# Altium integrated library Mastermind Devices.IntLib: 910 symbols (part 4 of 6) (continued)
## RK3566 (continued)
part D pins: 1A20 SDMMC1_D3/UART7_TX_M0/GPIO2_A6_U (io), 1C19 SDMMC1_D0/UART6_RX_M0/GPIO2_A3_U (io), 1C20 UART1_RX_M0/GPIO2_B3_U (io), 1D18 SDMMC1_D2/UART7_RX_M0/GPIO2_A5_U (io), 1D20 SDMMC0_D2/ARM_JTAG_TCK/UART5_~{CTS}_M0/GPIO1_D7_U (io), 1E18 SDMMC1_D1/UART6_TX_M0/GPIO2_A4_U (io), 1E19 SDMMC0_CMD/PWM10_M1/UART5_RX_M0/GPIO2_A1_U (io), 1E20 SDMMC0_D0/UART2_TX_M1/UART6_TX_M1/PWM8_M1/GPIO1_D5_U (io), 1F18 SDMMC0_D3/ARM_JTAG_TMS/UART5_~{RTS}_M0/GPIO2_A0_U (io), 1F19 SDMMC0_D1/UART2_RX_M1/UART6_RX_M1/PWM9_M1/GPIO1_D6_U (io), 1T4 VOP_BT1120_D11/GMAC1_TXD0_M0/I2C3_SCL_M1/PWM10_M0/GPIO3_B5_D (io), 1U3 VOP_BT1120_D10/GMAC1_RXER_M0/I2C5_SDA_M0/PDM_SDI1_M2/GPIO3_B4_D (io), 1U4 VOP_BT1120_CLK/GMAC1_TXCLK_M0/I2S3_SDI_M0/SDMMC2_CLK_M1/GPIO3_A6_D (io), 1U5 VOP_BT1120_D0/SPI1_CS0_M1/SDMMC2_D0_M1/GPIO3_A1_D (io), 1U18 UART2_TX_M0/GPIO0_D1_U (io), 1V2 VOP_BT1120_D12/GMAC1_TXD1_M0/I2C3_SDA_M1/PWM11_IR_M0/GPIO3_B6_D (io), 1V3 VOP_BT1120_D5/GMAC1_RXCLK_M0/SDMMC2_DET_M1/GPIO3_A7_D (io), 1V19 UART2_RX_M0/GPIO0_D0_U (io), A35 SDMMC1_PWREN/I2C4_SDA_M1/UART8_~{RTS}_M0/GPIO2_B1_D (io), AF37 SDMMC0_DET/SATA_CP_DET/GPIO0_A4_U (io), AG37 SDMMC0_PWREN/SATA_MP_SWITCH/PCIE20_~{CLKREQ}_M0/GPIO0_A5_D (io), AP3 VOP_BT1120_D14/SPI1_MISO_M1/UART5_TX_M1/I2S1_SDO3_M2/GPIO3_C2_D (io), AP4 VOP_BT1120_D13/SPI1_MOSI_M1/PCIE20_~{PERST}_M1/I2S1_SDO2_M2/GPIO3_C1_D (io), AP6 VOP_BT1120_D9/GMAC1_RXDV_CRS_M0/I2C5_SCL_M0/PDM_SDI0_M2/GPIO3_B3_D (io), AP7 VOP_BT1120_D7/GMAC1_RXD0_M0/UART4_RX_M1/PWM8_M0/GPIO3_B1_D (io), AP9 VOP_BT1120_D4/GMAC1_RXD3_M0/I2S3_SDO_M0/SDMMC2_CMD_M1/GPIO3_A5_D (io), AP10 VOP_BT1120_D2/GMAC1_TXD3_M0/I2S3_SCLK_M0/SDMMC2_D2_M1/GPIO3_A3_D (io), AR2 VOP_BT1120_D15/SPI1_CLK_M1/UART5_RX_M1/I2S1_SCLK_RX_M2/GPIO3_C3_D (io), AR6 VOP_BT1120_D8/GMAC1_RXD1_M0/UART4_TX_M1/PWM9_M0/GPIO3_B2_D (io), AR7 VOP_BT1120_D6/ETH1_REFCLKO_25M_M0/SDMMC2_PWREN_M1/GPIO3_B0_D (io), AR9 VOP_BT1120_D3/GMAC1_RXD2_M0/I2S3_LRCK_M0/SDMMC2_D3_M1/GPIO3_A4_D (io), AR10 VOP_BT1120_D1/GMAC1_TXD2_M0/I2S3_MCLK_M0/SDMMC2_D1_M1/GPIO3_A2_D (io), B34 SDMMC1_DET/I2C4_SCL_M1/UART8_~{CTS}_M0/GPIO2_B2_U (io), B35 SDMMC1_CMD/UART9_RX_M0/GPIO2_A7_U (io), B37 SDMMC1_CLK/UART9_TX_M0/GPIO2_B0_D (io), F37 UART1_~{RTS}_M0/SPI1_CLK_M0/GPIO2_B5_U (io), F38 UART1_TX_M0/GPIO2_B4_U (io), G37 UART1_~{CTS}_M0/SPI1_MISO_M0/GPIO2_B6_U (io), G38 SDMMC0_CLK/TEST_CLKOUT/UART5_TX_M0/GPIO2_A2_D (io)
part E pins: 1A1 ~{RAS} (io), 1A2 ~{ACT}/~{LPDDR}4_~{CKE}1_~{B}/~{DDR}3_~{CAS}/-/~{AC}1~{7} (io), 1A3 DDR4_A10/LPDDR4_CKE0_B/DDR3_A10/-/AC10 (io), 1A4 DDR4_BG0/LPDDR4_ODT1_CA_B/DDR3_~{WE}/-/AC20 (io), 1A5 ~{CS1} (io), 1A6 DDR4_BA1/LPDDR4_A4_B/DDR3_A12/LPDDR3_A4/AC19 (io), 1A7 DDR_DQ3_B/DDR4_DQU1_B/LPDDR4_DQ3_B/DDR3_DQ19/LPDDR3_DQ4 (io), 1A8 DDR_DQ2_B/DDR4_DQU3_B/LPDDR4_DQ2_B/DDR3_DQ18/LPDDR3_DQ6 (io), 1A9 DDR_DQ7_B/DDR4_DQU2_B/LPDDR4_DQ7_B/DDR3_DQ23/LPDDR3_DQ0 (io), 1A10 DDR_DQ5_B/DDR4_DQU6_B/LPDDR4_DQ5_B/DDR3_DQ21/LPDDR3_DQ3 (io), 1A11 DDR_DM1_B/DDR4_DML_B/LPDDR4_DM1_B/DDR3_DM3/LPDDR3_DM2 (io), 1B1 DDR4_A14_~{WE}/LPDDR4_A4_A/DDR3_A15/LPDDR3_A5/AC14 (io), 1B3 DDR4_A12/LPDDR4_A3_A/DDR3_BA2/-/AC12 (io), 1B5 ~{CS0} (io), 1B6 DDR4_A4/LPDDR4_A3_B/DDR3_BA1/LPDDR3_A3/AC4 (io), 1B7 DDR4_BA0/LPDDR4_A2_B/DDR3_A1/-/AC18 (io), 1B8 DDR_DM0_B/DDR4_DMU_B/LPDDR4_DM0_B/DDR3_DM2/LPDDR3_DM0 (io), 1B9 DDR_DQ6_B/DDR4_DQU4_B/LPDDR4_DQ6_B/DDR3_DQ22/LPDDR3_DQ7 (io), 1C1 DDR4_A15_~{CAS}/LPDDR4_A2_A/DDR3_A0/-/AC15 (io), 1C2 DDR4_BG1/LPDDR4_ODT1_CA_A/DDR3_BA0/-/AC21 (io), 1C3 DDR4_A3/LPDDR4_CKE1_A/DDR3_A3/-/AC3 (io), 1C7 ~{RESET} (io), 1C10 DDR_DQ14_B/DDR4_DQL1_B/LPDDR4_DQ14_B/DDR3_DQ30/LPDDR3_DQ20 (io), 1D2 DDR4_A1/-/DDR3_A2/-/AC1 (io), 1D4 DDR_AVSS (power), 1D5 DDRPHY_VDDQ_1 (power), 1D6 DDRPHY_VDDQ_2 (power), 1D7 DDRPHY_VDDQ_3 (power), 1D8 DDRPHY_VDDQ_4 (power), 1D9 DDRPHY_VDDQ_5 (power), 1E1 DDR_DQ7_A/DDR4_DQL1_A/LPDDR4_DQ7_A/DDR3_DQ7/LPDDR3_DQ11 (io), 1E2 DDR_DM0_A/DDR4_DML_A/LPDDR4_DM0_A/DDR3_DM0/LPDDR3_DM1 (io), 1E4 DDRPHY_VDDQ_6 (power), 1E6 DDRPHY_VDDQL_1 (power), 1E7 DDRPHY_VDDQL_2 (power), 1E9 DDRPHY_VDDQL_3 (power), 1F1 DDR_DQ14_A/DDR4_DQU6_A/LPDDR4_DQ14_A/DDR3_DQ14/LPDDR3_DQ30 (io), 1F2 DDR_DQ13_A/DDR4_DQU4_A/LPDDR4_DQ13_A/DDR3_DQ13/LPDDR3_DQ31 (io), 1F3 DDR_RZQ (io), 1F4 DDRPHY_VDDQ_7 (power), 1F5 DDRPHY_VDDQL_4 (power), 1G1 DDR_DM1_A/DDR4_DMU_A/LPDDR4_DM1_A/DDR3_DM1/LPDDR3_DM3 (io), 1G2 DDR_DQ15_A/DDR4_DQU0_A/LPDDR4_DQ15_A/DDR3_DQ15/LPDDR3_DQ27 (io), 1G4 DDRPHY_VDDQ_8 (power), 1G5 DDRPHY_VDDQL_5 (power), 1H3 DDR_VREFOUT (out), A3 ~{CS1} (io), A5 DDR4_CLKP/LPDDR4_CLKP_A/DDR3_CLKP/LPDDR3_CLKP/AC23 (io), A7 DDR4_A0/LPDDR4_CLKP_B/DDR3_A9/-/AC0 (io), A9 DDR4_A13/LPDDR4_A0_B/DDR3_A14/LPDDR3_A0/AC13 (io), A10 DDR4_A7/LPDDR4_ODT0_CA_B/DDR3_A8/-/AC7 (io), A12 DDR_DQS0N_B/DDR4_DQSU_N_B/LPDDR4_DQS0N_B/DDR3_DQS2N/LPDDR3_DQS0N (io), A13 DDR_DQS0P_B/DDR4_DQSU_P_B/LPDDR4_DQS0P_B/DDR3_DQS2P/LPDDR3_DQS0P (io), A15 DDR_DQ12_B/DDR4_DQL7_B/LPDDR4_DQ12_B/DDR3_DQ28/LPDDR3_DQ16 (io), A17 DDR_DQS1P_B/DDR4_DQSL_P_B/LPDDR4_DQS1P_B/DDR3_DQS3P/LPDDR3_DQS2P (io), A19 DDR_DQ9_B/DDR4_DQL2_B/LPDDR4_DQ9_B/DDR3_DQ25/LPDDR3_DQ19 (io), A20 DDR_DQ10_B/DDR4_DQL4_B/LPDDR4_DQ10_B/DDR3_DQ26/LPDDR3_DQ22 (io), B3 ~{CS0} (io), B4 DDR4_CKE/LPDDR4_CKE0_A/DDR3_CKE/LPDDR3_CKE/AC22 (io), B5 DDR4_CLKN/LPDDR4_CLKN_A/DDR3_CLKN/LPDDR3_CLKN/AC24 (io), B7 DDR4_A9/LPDDR4_CLKN_B/DDR3_A5/-/AC9 (io), B8 DDR4_A5/LPDDR4_A5_B/DDR3_A11/LPDDR3_A2/AC5 (io), B9 DDR4_A6/LPDDR4_A1_B/DDR3_A13/LPDDR3_A1/AC6 (io), B10 DDR_DQ1_B/DDR4_DQU5_B/LPDDR4_DQ1_B/DDR3_DQ17/LPDDR3_DQ5 (io), B12 DDR_DQ0_B/DDR4_DQU7_B/LPDDR4_DQ0_B/DDR3_DQ16/LPDDR3_DQ1 (io), B13 DDR_DQ4_B/DDR4_DQU0_B/LPDDR4_DQ4_B/DDR3_DQ20/LPDDR3_DQ2 (io), B15 DDR_DQ13_B/DDR4_DQL5_B/LPDDR4_DQ13_B/DDR3_DQ29/LPDDR3_DQ17 (io), B16 DDR_DQ15_B/DDR4_DQL3_B/LPDDR4_DQ15_B/DDR3_DQ31/LPDDR3_DQ21 (io), B17 DDR_DQS1N_B/DDR4_DQSL_N_B/LPDDR4_DQS1N_B/DDR3_DQS3N/LPDDR3_DQS2N (io), B19 DDR_DQ8_B/DDR4_DQL0_B/LPDDR4_DQ8_B/DDR3_DQ24/LPDDR3_DQ18 (io), B20 DDR_DQ11_B/DDR4_DQL6_B/LPDDR4_DQ11_B/DDR3_DQ27/LPDDR3_DQ23 (io), C1 DDR4_A2/LPDDR4_A1_A/DDR3_A4/LPDDR3_A6/AC2 (io), C2 DDR4_A11/LPDDR4_A0_A/DDR3_A7/LPDDR3_A8/AC11 (io), E1 DDR_DQ3_A/DDR4_DQL6_A/LPDDR4_DQ3_A/DDR3_DQ3/LPDDR3_DQ9 (io), E2 DDR4_A8/LPDDR4_ODT0_CA_A/DDR3_A6/LPDDR3_A9/AC8 (io), F1 DDR_DQ2_A/DDR4_DQL4_A/LPDDR4_DQ2_A/DDR3_DQ2/LPDDR3_DQ10 (io), F2 DDR_DQ1_A/DDR4_DQL2_A/LPDDR4_DQ1_A/DDR3_DQ1/LPDDR3_DQ14 (io), G2 DDR_DQ0_A/DDR4_DQL0_A/LPDDR4_DQ0_A/DDR3_DQ0/LPDDR3_DQ15 (io), H1 DDR_DQS0N_A/DDR4_DQSL_N_A/LPDDR4_DQS0N_A/DDR3_DQS0N/LPDDR3_DQS1N (io), H2 DDR_DQS0P_A/DDR4_DQSL_P_A/LPDDR4_DQS0P_A/DDR3_DQS0P/LPDDR3_DQS1P (io), K1 DDR_DQ5_A/DDR4_DQL5_A/LPDDR4_DQ5_A/DDR3_DQ5/LPDDR3_DQ12 (io), K2 DDR_DQ6_A/DDR4_DQL3_A/LPDDR4_DQ6_A/DDR3_DQ6/LPDDR3_DQ8 (io), M1 DDR_DQ12_A/DDR4_DQU2_A/LPDDR4_DQ12_A/DDR3_DQ12/LPDDR3_DQ26 (io), M2 DDR_DQ4_A/DDR4_DQL7_A/LPDDR4_DQ4_A/DDR3_DQ4/LPDDR3_DQ13 (io), N1 DDR_DQS1P_A/DDR4_DQSU_P_A/LPDDR4_DQS1P_A/DDR3_DQS1P/LPDDR3_DQS3P (io), N2 DDR_DQS1N_A/DDR4_DQSU_N_A/LPDDR4_DQS1N_A/DDR3_DQS1N/LPDDR3_DQS3N (io), P2 DDR_DQ8_A/DDR4_DQU3_A/LPDDR4_DQ8_A/DDR3_DQ8/LPDDR3_DQ25 (io), R1 DDR_DQ9_A/DDR4_DQU1_A/LPDDR4_DQ9_A/DDR3_DQ9/LPDDR3_DQ24 (io), R2 DDR_DQ10_A/DDR4_DQU7_A/LPDDR4_DQ10_A/DDR3_DQ10/LPDDR3_DQ28 (io), T2 DDR_DQ11_A/DDR4_DQU5_A/LPDDR4_DQ11_A/DDR3_DQ11/LPDDR3_DQ29 (io)
part F pins: 1C12 VDD_CPU_1 (power), 1C13 VCCIO2 (power), 1D11 VDD_CPU_2 (power), 1D12 VDD_CPU_3 (power), 1D13 VCCIO1 (power), 1D15 OTP_VCC18 (power), 1E11 VDD_CPU_4 (power), 1E12 VDD_CPU_5 (power), 1E13 VDD_CPU_6 (power), 1E16 VCCIO4 (power), 1F11 VDD_CPU_7 (power), 1F12 VDD_CPU_8 (power), 1F13 VDD_CPU_9 (power), 1F14 VDD_CPU_10 (power), 1F17 VCCIO3 (power), 1G13 VDD_CPU_11 (power), 1G15 VDD_NPU_1 (power), 1H7 VDD_LOGIC_1 (power), 1H8 VDD_LOGIC_2 (power), 1H9 VDD_LOGIC_3 (power), 1H10 VDD_LOGIC_4 (power), 1H14 VDD_NPU_2 (power), 1H15 VDD_NPU_3 (power), 1J7 VDD_LOGIC_5 (power), 1J10 VDD_LOGIC_6 (power), 1J14 VDD_NPU_4 (power), 1J15 VDD_NPU_5 (power), 1K7 VDD_LOGIC_7 (power), 1K10 VDD_LOGIC_8 (power), 1L4 VCCIO6_1 (power), 1L5 VCCIO6_2 (power), 1L7 VDD_LOGIC_9 (power), 1L8 VDD_GPU_1 (power), 1L9 VDD_GPU_2 (power), 1M7 VDD_GPU_3 (power), 1M8 VDD_GPU_4 (power), 1M9 VDD_GPU_5 (power), 1N5 VCCIO5_1 (power), 1N6 VCCIO5_2 (power), 1N8 VCCIO7 (power)
part G pins: 1F20 AVSS1_6 (power), 1G16 AVSS1_7 (power), 1G18 AVSS1_8 (power), 1G19 AVSS1_9 (power), 1G20 AVSS1_10 (power), 1J16 AVSS1_11 (power), 1J18 AVSS1_12 (power), 1K18 AVSS1_13 (power), 1L19 AVSS1_14 (power), 1M18 TVSS (power), 1N11 AVSS_9 (power), 1N12 AVSS_10 (power), 1P8 AVSS_11 (power), 1P10 AVSS_12 (power), 1P14 AVSS_13 (power), 1R8 AVSS_14 (power), 1R9 AVSS_15 (power), 1R11 AVSS_16 (power), 1R12 AVSS_17 (power), 1R13 AVSS_18 (power), 1R14 AVSS_19 (power), 1R15 AVSS_20 (power), 1T7 AVSS_21 (power), 1T8 AVSS_22 (power), 1T9 AVSS_23 (power), 1T10 AVSS_24 (power), 1T11 AVSS_25 (power), 1T12 AVSS_26 (power), 1T13 AVSS_27 (power), 1T14 AVSS_28 (power), 1T15 AVSS_29 (power), 1T16 AVSS_30 (power), 1T17 AVSS_31 (power), 1U12 AVSS_32 (power), 1U13 AVSS_33 (power), 1U15 AVSS_34 (power), 1U17 AVSS_35 (power), 1V7 AVSS_36 (power), 1V12 AVSS_37 (power), 1V13 AVSS_38 (power), 1V18 AVSS_39 (power), AP13 AVSS_1 (power), AP16 AVSS_2 (power), AP19 AVSS_3 (power), AP22 AVSS_4 (power), AP25 AVSS_5 (power), AP28 AVSS_6 (power), AP31 AVSS_7 (power), AP34 AVSS_8 (power), H37 AVSS1_1 (power), L37 AVSS1_2 (power), P37 AVSS1_3 (power), U37 AVSS1_4 (power), Y37 AVSS1_5 (power)
part H pins: 1B10 VSS_30 (power), 1B11 VSS_31 (power), 1B15 VSS_32 (power), 1B19 VSS_33 (power), 1C4 VSS_34 (power), 1C5 VSS_35 (power), 1C6 VSS_36 (power), 1C8 VSS_37 (power), 1C9 VSS_38 (power), 1C14 VSS_39 (power), 1C16 VSS_40 (power), 1C18 VSS_41 (power), 1D1 VSS_42 (power), 1D3 VSS_43 (power), 1D10 VSS_44 (power), 1D14 VSS_45 (power), 1E3 VSS_46 (power), 1E8 VSS_47 (power), 1E10 VSS_48 (power), 1E14 VSS_49 (power), 1E15 VSS_50 (power), 1E17 VSS_51 (power), 1F6 VSS_52 (power), 1F7 VSS_53 (power), 1F8 VSS_54 (power), 1F9 VSS_55 (power), 1F10 VSS_56 (power), 1F15 VSS_57 (power), 1F16 VSS_58 (power), 1G3 VSS_59 (power), 1G6 VSS_60 (power), 1G7 VSS_61 (power), 1G8 VSS_62 (power), 1G9 VSS_63 (power), 1G10 VSS_64 (power), 1G11 VSS_65 (power), 1G12 VSS_66 (power), A1 VSS_1 (power), A2 VSS_2 (power), A38 VSS_3 (power), AA2 VSS_18 (power), AC37 VSS_24 (power), AD2 VSS_19 (power), AE37 VSS_25 (power), AH37 VSS_26 (power), AL37 VSS_27 (power), AP2 VSS_20 (power), AP8 VSS_22 (power), AP37 VSS_28 (power), AR1 VSS_21 (power), AR38 VSS_29 (power), B1 VSS_4 (power), B2 VSS_5 (power), B6 VSS_6 (power), B11 VSS_7 (power), B14 VSS_8 (power), B18 VSS_9 (power), B21 VSS_10 (power), B28 VSS_11 (power), B31 VSS_12 (power), D2 VSS_13 (power), E37 VSS_23 (power), J2 VSS_14 (power), L2 VSS_15 (power), U2 VSS_16 (power), W2 VSS_17 (power)
part I pins: 1G14 VSS_67 (power), 1H1 VSS_68 (power), 1H2 VSS_69 (power), 1H6 VSS_70 (power), 1H11 VSS_71 (power), 1H12 VSS_72 (power), 1H13 VSS_73 (power), 1J1 VSS_74 (power), 1J6 VSS_75 (power), 1J8 VSS_76 (power), 1J9 VSS_77 (power), 1J11 VSS_78 (power), 1J12 VSS_79 (power), 1J13 VSS_80 (power), 1K2 VSS_81 (power), 1K3 VSS_82 (power), 1K4 VSS_83 (power), 1K5 VSS_84 (power), 1K6 VSS_85 (power), 1K8 VSS_86 (power), 1K9 VSS_87 (power), 1K11 VSS_88 (power), 1K12 VSS_89 (power), 1K13 VSS_90 (power), 1K14 VSS_91 (power), 1K15 VSS_92 (power), 1L3 VSS_93 (power), 1L6 VSS_94 (power), 1L10 VSS_95 (power), 1L11 VSS_96 (power), 1L12 VSS_97 (power), 1L13 VSS_98 (power), 1L14 VSS_99 (power), 1L15 VSS_100 (power), 1M3 VSS_101 (power), 1M4 VSS_102 (power), 1M5 VSS_103 (power), 1M6 VSS_104 (power), 1M10 VSS_105 (power), 1M11 VSS_106 (power), 1M12 VSS_107 (power), 1M13 VSS_108 (power), 1M14 VSS_109 (power), 1M15 VSS_110 (power), 1M16 VSS_111 (power), 1M17 VSS_112 (power), 1M20 VSS_113 (power), 1N3 VSS_114 (power), 1N4 VSS_115 (power), 1N7 VSS_116 (power), 1P1 VSS_117 (power), 1P5 VSS_118 (power), 1P6 VSS_119 (power), 1P7 VSS_120 (power), 1P15 VSS_121 (power), 1R3 VSS_122 (power), 1R4 VSS_123 (power), 1R5 VSS_124 (power), 1R6 VSS_125 (power), 1R7 VSS_126 (power), 1T3 VSS_127 (power), 1T5 VSS_128 (power), 1U2 VSS_129 (power), 1V1 VSS_130 (power), 1V4 VSS_131 (power)

## ROCKER_SW-DPST
designator S?, comment SW-DPST
Double-Pole, Single-Throw Switch; Published: 24-Mar-1999; LatestRevisionDate: 17-Jul-2002; LatestRevisionNote: Re-released for DXP Platform.; PackageReference: DPST-4; Publisher: Altium Limited; PackageDescription: Switch; 4 Leads
footprint HDR2X2-TE-CON (Connector; Header; 5x2 Position)
pins: 1 COMMON1, 2 NO1, 3 COMMON2, 4 NO2

## RPI-ZERO
designator Controller?, comment Maxim MAX1898 li-poly battery charger    http://www.ladyada.net/library/eagle  (value not drawn)
footprint RPI_ZERO_BOARD_FULL
pins: 1 3V3, 2 5V, 3 SDA1, 4 5V, 5 SCL1, 6 GND, 7 GPIO7, 8 TXD (power), 9 GND, 10 RXD, 11 GPIO0, 12 GPIO1, 13 GPIO2, 14 GND, 15 GPIO3, 16 GPIO4, 17 3V3, 18 GPIO5, 19 MOSI, 20 GND, 21 MISO, 22 GPIO6, 23 SCLK, 24 CE0, 25 GND, 26 CE1, 27 CDA0, 28 SCL0, 29 GPIO21, 30 GND, 31 GPIO22, 32 GPIO26, 33 GPIO23, 34 GND, 35 GPIO24, 36 GPIO27, 37 GPIO25, 38 GPIO28, 39 GND, 40 GPIO29
text: RPI_ZERO

## RPot1 SM
designator R?, comment 20K
Square Trimming Potentiometer; AEMS Code: 1400226
3D model SquarePot (PCB3D Model)
footprint 3296Y (Multi-Turn Potentiometer)
footprint 3662P (Single Turn/Trimming Potentiometer)
pins: CCW -, CW +, W
1 alternate drawing of the same symbol

## RPot SM
designator R?, comment 20K  (value not drawn)
Square Trimming Potentiometer; AEMS Code: 1400226
3D model SquarePot (PCB3D Model)
footprint 3296Y (Multi-Turn Potentiometer)
footprint RES-ADJ_3362P
pins: CCW -, CW +, W
1 alternate drawing of the same symbol

## RPot SM_1
designator R1, comment RPot
Square Trimming Potentiometer; AEMS Code: 1400226
3D model SquarePot (PCB3D Model)
footprint 3296Y (Multi-Turn Potentiometer)
footprint RES-ADJ_3362P
footprint pot smd
footprint POT4MM-2
footprint POT4MM-2 - duplicate
pins: CCW -, CW +, W
1 alternate drawing of the same symbol

## RPot SM_volume
designator R?, comment 20K  (value not drawn)
Square Trimming Potentiometer; AEMS Code: 1400226
part A pins: 1 CW, 2 W, 3 CCW
part B pins: 4 CW, 5 W, 6 CCW
1 alternate drawing of the same symbol

## RTL8211E_VB_CG
designator U6
Ethernet Transceivers 10/100/1000 Base-T PHY GMII, MII, RGMII 1.43V ~ 3.63V QFN-48_6x6x04P Ethernet ICs RoHS / LIBs : By AAR; Mfr_Part_No: RTL8211E-VB-CG; ComponentLink1Description: LCSC; ComponentLink1URL: https://lcsc.com/product-detail/_REALTEK_RTL8211E-VB-CG_RTL8211E-VB-CG_C90735.html?currency=SGD; foot print: QFN-48_6x6x04P; LCSC Part #: C90735; Package: QFN-48_6x6x04P
footprint QFN40P600X600X100-49N (QFN40P600X600X100-49N_AAR)
pins: 1 MDI[0]+, 2 MDI[0]-, 3 AVDD10_1, 4 MDI[1]+, 5 MDI[1]-, 6 AVDD33_1 (power), 7 MDI[2]+, 8 MDI[2]-, 9 AVDD10_2 (power), 10 MDI[3]+, 11 MDI[3]-, 12 NC, 13 RXCTL/PHYAD2, 14 RXD0/SELRGV, 15 DVDD33_1 (power), 16 RXD1/TXDLY, 17 RXD2/AN0, 18 RXD3/AN1, 19 RXC, 20 INTB, 21 DVDD33_2 (power), 22 TXC, 23 TXD0, 24 TXD1, 25 TXD2, 26 TXD3, 27 TXCTL, 28 DVDD10_1, 29 PHYRSTB, 30 MDC, 31 MDIO, 32 LED2_RXDLY, 33 PMEB, 34 LED0/PHYAD0, 35 LED1/PHYAD1, 36 DVDD10_2, 37 DVDD33_3 (power), 38 ENSWREG, 39 RSET, 40 AVDD10 (power), 41 AVDD33_2 (power), 42 CKXTAL1, 43 CKXTAL2, 44 VDDREG1 (power), 45 VDDREG2 (power), 46 CLK125, 47 GND (power), 48 REGOUT, 49 GND(EPAD)

## RTL8211F-CG
designator U1
Manufacturer: REALTEK(瑞昱); Contributor: LCSC; Supplier: LCSC; Supplier Part: C187932; Manufacturer Part: RTL8211F-CG; JLCPCB Part Class: Extended Part; spicePre: U; spiceSymbolName: RTL8211F-CG
footprint WQFN-40_L5.0-W5.0-P0.4-BL-EP
pins: 1 MDIP0, 2 MDIN0, 3 AVDD10, 4 MDIP1, 5 MDIN1, 6 MDIP2, 7 MDIN2, 8 AVDD10, 9 MDIP3, 10 MDIN3, 11 AVDD33, 12 PHYRSTB, 13 MDC, 14 MDIO, 15 TXD3, 16 TXD2, 17 TXD1, 18 TXD0, 19 TXCTL, 20 TXC, 21 DVDD10, 22 PHYAD0/RXD3, 23 PLLOFF/RXD2, 24 TXDLY/RXD1, 25 RXDLY/RXD0, 26 PHYAD2/RXCTL, 27 PHYAD1/RXC, 28 DVDD_RG, 29 DVDD33, 30 REGOUT, 31 INTB/PMEB, 32 CFG_EXT/LED0, 33 CFG_LDO0/LED1, 34 CFG_LDO1/LED2, 35 CLKOUT, 36 XTAL_IN, 37 XTAL_OUT/EXT_CLK, 38 AVDD10, 39 RSET, 40 AVDD33, 41 GND

## S9015
designator Q1, comment 2N3906
PNP General Purpose Amplifier; Published: 8-Jun-2000; LatestRevisionDate: 15-Jan-2003; LatestRevisionNote: PCB Footprint 'BCY-W3/D4.7' replaced; DatasheetVersion: 1997; PackageVersion: Sep-1998; PackageReference: TO-92A; Publisher: Altium Limited; PackageDescription: TO, Flat Index; 3 In-Line, Axial Leads; Body Dia. 4.5mm; Leads 0.51 x 0.48 mm (max); ComponentLink1Description: Manufacturer Link; ComponentLink1URL: http://www.fairchildsemi.com/; ComponentLink2Description: Datasheet; ComponentLink2URL: http://www.fairchildsemi.com/ds/2N%2F2N3906.pdf
footprint SOT23
pins: 1 B, 2 E, 3 C

## S-35390A-T
designator IC?, comment S-35390A  2-WIRE REAL-TIME CLOCK   The S-35390A is a CMOS 2-wire real-time clock IC which operates with the very low current consumption and in the wide range of operation voltage. The operation voltage is 1.3 V to 5.5 V so that this IC can be used for various power supplies from main supply to backup battery. Due to the 0.25 ?A current consumption and wide range of power supply voltage at time keeping, this IC makes the battery life longer. In the system which operates with a backup battery, the included free registers can be used as the function for user?s backup memory  (value not drawn)
footprint TSSOP-8
pins: 1 /INT1 (out), 2 XTALO (out), 3 XTALI, 4 VSS (power), 5 /INT2 (out), 6 SCL, 7 SDA, 8 VDD (power)

## SB
designator SB
RESISTOR, American symbol
footprint SB
footprint Jumper-NO
pins: 1, 2

## SC04B
designator U
SOP-16_L10.0-W3.9-P1.27-LS6.0-BL; MF: Vishay Semiconductor; MP: TCMT4606; Digi-Key_Part_Number: TCMT4606CT-ND; DigiKey-Purchase-URL: https://snapeda.com/shop?store=DigiKey&id=649284; Package: SOP-16 Vishay; Value: *; SnapEDA_Link: https://www.snapeda.com/parts/TCMT4606/Vishay%20Semiconductor%20Opto%20Division/view-part/649284/?ref=snap
footprint SO-16
pins: 1 GND, 2 CMOD, 3 CDC, 4 CIN0, 5 CIN1, 6 CIN2, 7 CIN3, 8 NC, 9 NC, 10 OUT3, 11 OUT2, 12 OUT1, 13 OUT0, 14 SLPEN, 15 MD, 16 VDD

## SCR
designator Q?
Silicon Controlled Rectifier; Published: 8-Jun-2000; LatestRevisionDate: 17-Jul-2002; LatestRevisionNote: Re-released for DXP Platform.; PackageReference: TO-220-AB; Publisher: Altium Limited; Code_JEDEC: TO-220-AB
simulation model SCR (Spice Subcircuit)
footprint SOT23
pins: 1 K, 3 A, 3 G

## SCREW-BLACK
designator S2, comment M3 x 6mm Black Zinc Screw  (mechanical)
M3 Black-Zinc Cross-Recess Pan-Head Machine Screw 6mm long; Status: Unreleased; Category: Mechanical

## SCREWTERMINAL-H2-5.0
designator J?, comment KF301-5.0-2P
1x2P Through Hole P=5mm Screw Terminal Blocks ROHS
footprint SCREWTERMINAL-5MM-2
pins: 1, 2

## SCREWTERMINAL-H3-5.0
designator J?, comment Terminal Block 3.5mmPitch: 3,5 mmNumber of pins: 2Created by Rembrandt Electronicswww.rembrandtelectronics.com  (value not drawn)
GateName_1: -1; SymbolName_1: TERMINAL-BLOCK-PIN-3.5MM
footprint SCREWTERMINAL-5MM-3
footprint CONN-TH_3P-P5.00_DB126V-5.0-3P
pins: 1, 2, 3

## SCREWTERMINAL-H4-5.0
designator J?, comment Terminal Block 3.5mmPitch: 3,5 mmNumber of pins: 2Created by Rembrandt Electronicswww.rembrandtelectronics.com  (value not drawn)
GateName_1: -1; SymbolName_1: TERMINAL-BLOCK-PIN-3.5MM
footprint SCREWTERMINAL-5MM-4
pins: 1, 2, 3, 4

## SD-CARD
designator J?
Mfr. Part No.: 5033981892; Unit Price (USD): 2.41; Supplier Part No.: WM11190CT-ND; Supplier: Digikey Electronics
pins: 1 DAT2, 2 CD/DAT3, 3 CMD, 4 VDD (power), 5 CLK, 6 VSS (power), 7 DAT0, 8 DAT1, 9 CD_SW (power), SH SHIELD

## SDMMC06132
designator ?, comment SD MMC Card holder   4UCON part #06132 - easy to solder  (value not drawn)
footprint 06132
pins: 1 CS, 2 DATA_IN, 3 VSS1 (oe), 4 VDD (oe), 5 SCLK, 6 VSS2 (oe), 7 DATA_OUT (out), 8 DAT1, 9 DAT2, CD CARD_DETECT, GP GND (oe), GP3 COMMON_SW, WP WRITE_PROTECT

## SDMMCSCDA
designator ?, comment SD MMC Card holder   4UCON part #06132 - easy to solder  (value not drawn)
footprint SCDA
pins: 1 CS, 2 DATA_IN, 3 VSS1 (oe), 4 VDD (oe), 5 SCLK, 6 VSS2 (oe), 7 DATA_OUT (out), 8 DAT1, 9 DAT2, 10 CARD_DETECT, 11 COMMON_SW, 12 WRITE_PROTECT, 13 GND (oe)

## SE3N150P
designator Q?
Manufacturer: SINO-IC(光宇睿芯); Add into BOM: yes; Symbol: SE3N150P; Device: SE3N150P; LCSC Part Name: SE3N150P; Supplier Part: C2920986; Manufacturer Part: SE3N150P; Supplier Footprint: TO-3PF-3; JLCPCB Part Class: Extended Part; Datasheet: https://atta.szlcsc.com/upload/public/pdf/source/20211117/FFE5CEC9BFC8557C2FE4743940B1080E.pdf; Supplier: LCSC; Convert to PCB: yes
footprint TO-3PHIS_L15.8-W5.8-P5.45-L
pins: 1 G, 2 D, 3 S

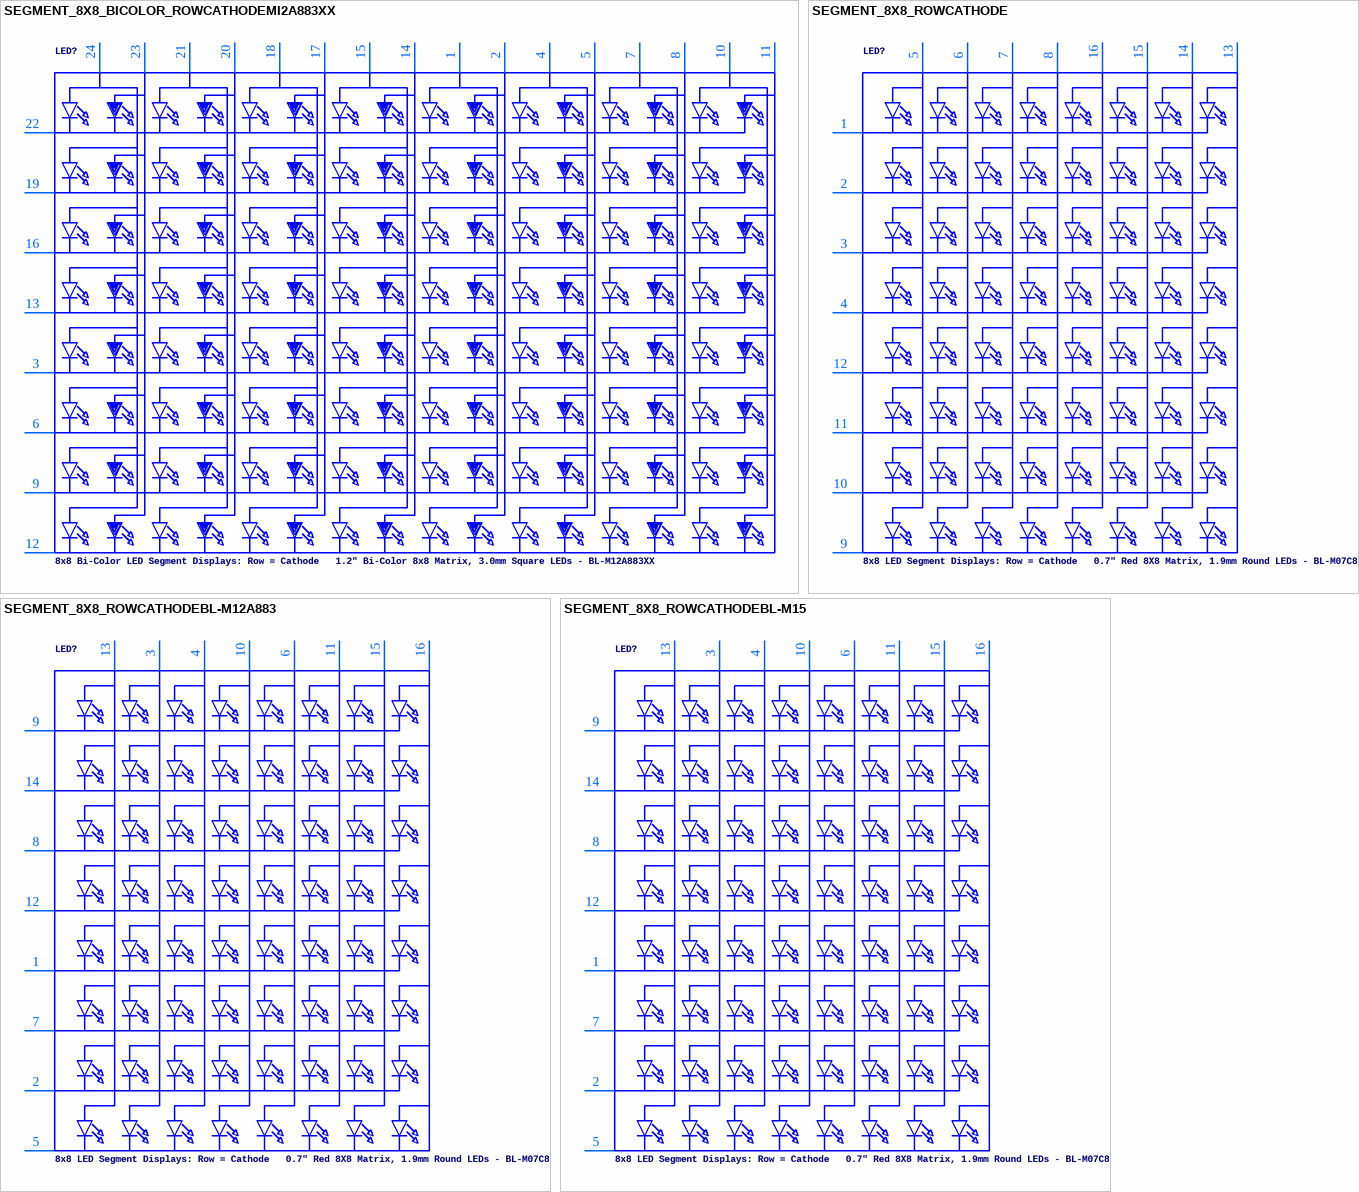
[diagram p28: symbols SEGMENT_8X8_BICOLOR_ROWCATHODEMI2A883XX to SEGMENT_8X8_ROWCATHODEBL-M15]

## SEGMENT_8X8_BICOLOR_ROWCATHODEMI2A883XX
designator LED?, comment 8x8 Bi-Color LED Segment Displays: Row = Cathode   1.2" Bi-Color 8x8 Matrix, 3.0mm Square LEDs - BL-M12A883XX
footprint SEGMENT_BICOL_BL-M12A883XX
pins: 1 A9, 2 A10, 3 K5, 4 A11, 5 A12, 6 K6, 7 A13, 8 A14, 9 K7, 10 A15, 11 A16, 12 K8, 13 K4, 14 A8, 15 A7, 16 K3, 17 A6, 18 A5, 19 K2, 20 A4, 21 A3, 22 K1, 23 A2, 24 A1

## SEGMENT_8X8_ROWCATHODE
designator LED?, comment 8x8 LED Segment Displays: Row = Cathode   0.7" Red 8X8 Matrix, 1.9mm Round LEDs - BL-M07C881UR   1.2" Red 8x8 Matrix, 3.0mm Round LEDs - BL-M12A881UR   1.2" Red 8x8 Matrix, 3.0mm Square LEDs - BL-M12A883
footprint SEGMENT_BL-M07C881UR
pins: 1 K1, 2 K2, 3 K3, 4 K4, 5 A1, 6 A2, 7 A3, 8 A4, 9 K8, 10 K7, 11 K6, 12 K5, 13 A8, 14 A7, 15 A6, 16 A5

## SEGMENT_8X8_ROWCATHODEBL-M12A883
designator LED?, comment 8x8 LED Segment Displays: Row = Cathode   0.7" Red 8X8 Matrix, 1.9mm Round LEDs - BL-M07C881UR   1.2" Red 8x8 Matrix, 3.0mm Round LEDs - BL-M12A881UR   1.2" Red 8x8 Matrix, 3.0mm Square LEDs - BL-M12A883
footprint SEGMENT_BL-M12A883
pins: 1 K5, 2 K7, 3 A2, 4 A3, 5 K8, 6 A5, 7 K6, 8 K3, 9 K1, 10 A4, 11 A6, 12 K4, 13 A1, 14 K2, 15 A7, 16 A8

## SEGMENT_8X8_ROWCATHODEBL-M15
designator LED?, comment 8x8 LED Segment Displays: Row = Cathode   0.7" Red 8X8 Matrix, 1.9mm Round LEDs - BL-M07C881UR   1.2" Red 8x8 Matrix, 3.0mm Round LEDs - BL-M12A881UR   1.2" Red 8x8 Matrix, 3.0mm Square LEDs - BL-M12A883
footprint SEGMENT_BL-M15A881
pins: 1 K5, 2 K7, 3 A2, 4 A3, 5 K8, 6 A5, 7 K6, 8 K3, 9 K1, 10 A4, 11 A6, 12 K4, 13 A1, 14 K2, 15 A7, 16 A8

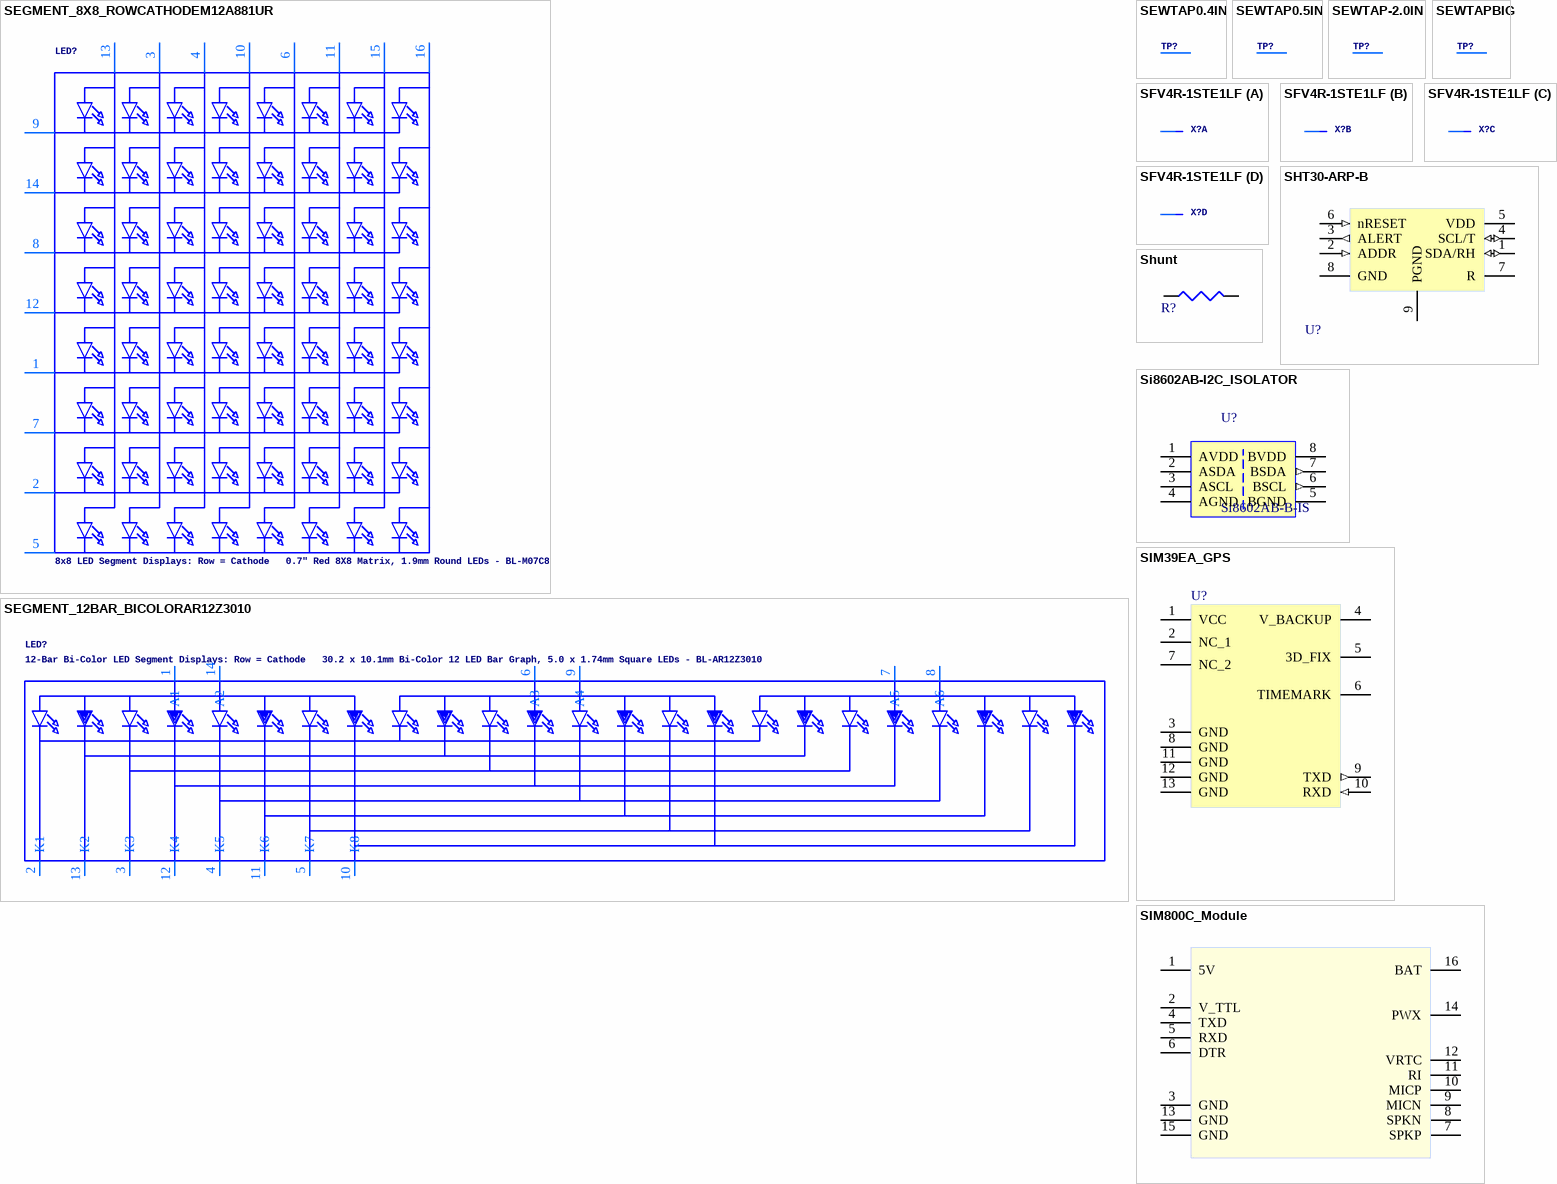
[diagram p29: symbols SEGMENT_8X8_ROWCATHODEM12A881UR to SIM800C_Module]